# Altium footprint library Pasivos.PcbLib: 55 footprints (part 4 of 4)
Each footprint in its own frame and in the unit in brackets; x right, y up, seen from the top. Pads: shape width x height; smd on the part's side, far side on the other; paste and mask are expansions set on the pad; w line width, h text height; cw(c..) or ccw(c..) is an arc to the next point about the centre after c.
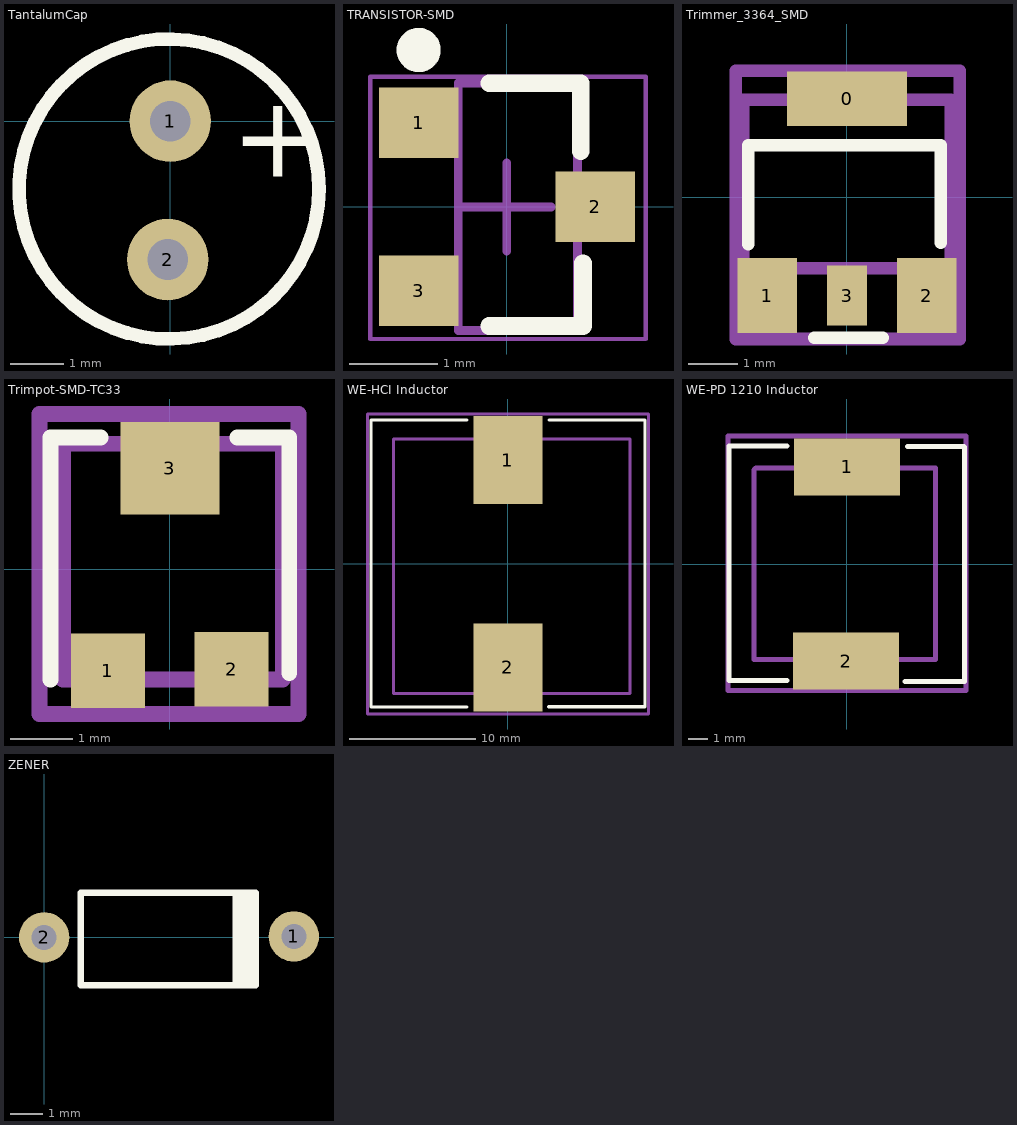
[diagram p3: the footprints below, top view; thin cyan lines are the x and y axes]

## TantalumCap [mil] "Tantalum Capacitor"
pads (2):
  round 60 hole 30: 1(0,0) 2(-2,-102)
Top Overlay:
  circle w10: c-1,-50 r110.49
  text "+" at 45,-41 h60
3D body: height 334.65, standoff -98.43, extent -83.62,-137.08 87.62,34

## TRANSISTOR-SMD [mm] "BC848B"
height 1
pads (3):
  rect 0.9x0.8 smd: 1(-1,0.95) 2(1,0) 3(-1,-0.95)
Top Overlay:
  circle w0.25: c-1,1.775 r0.125
  lines w0.2: -0.2,-1.351 0.862,-1.351 0.862,-0.64 ; -0.2,1.4 0.836,1.4 0.836,0.63
Mechanical 13:
  lines w0.1: -0.55,-1.402 -0.55,1.4 0.8,1.4 0.8,-1.402 -0.55,-1.402
Mechanical 15:
  lines w0.05: -1.549,-1.499 -1.549,1.473 1.575,1.473 1.575,-1.499 -1.549,-1.499
  lines w0.1: -0.502,-0.005 0.498,-0.005 ; -0.002,-0.505 -0.002,0.495
3D body: height 1.3, standoff 0, extent -1.426,-1.505 1.574,1.495

## Trimmer_3364_SMD [mm] "Surface Mount Trimmer Potentiometer Cermet Top Adjustment"
pads (4):
  rect 2.4x1.1 smd: 0(0,1.975)
  rect 1.2x1.5 smd: 1(-1.6,-1.975) 2(1.6,-1.975)
  rect 0.8x1.2 smd: 3(0,-1.975)
Top Overlay:
  lines w0.254: -1.981,-0.941 -1.981,1.04 1.88,1.04 1.88,-0.916 ; -0.66,-2.821 0.711,-2.821
Mechanical 13:
  lines w0.254: -2.083,-1.424 -2.083,1.955 2.083,1.955 2.083,-1.424 -2.083,-1.424
Mechanical 15:
  lines w0.254: -2.235,-2.846 2.261,-2.846 ; -2.235,-2.795 -2.235,2.539 2.261,2.539 ; 2.261,-2.795 2.261,2.513
3D body: height 1.01, standoff -0.06, extent -1.905,-2.269 1.895,1.961

## Trimpot-SMD-TC33 [mm] "Surface Mount Trimmer Potentiometer Cermet Top Adjustment"
pads (3):
  rect 1.2x1.2 smd: 1(-1,-1.638) 2(1,-1.612)
  rect 1.6x1.5 smd: 3(0,1.638)
Top Overlay:
  lines w0.254: -1.93,-1.778 -1.93,2.134 -1.118,2.134 ; 1.092,2.134 1.93,2.134 1.93,-1.676
Mechanical 13:
  lines w0.254: 1.753,2.032 -1.727,2.032 -1.727,-1.778 1.829,-1.778 1.829,1.956
Mechanical 15:
  lines w0.254: -2.108,-2.337 -2.108,2.515 2.083,2.515 2.083,-2.337 -2.108,-2.337
3D body: height 1.13, standoff -0.02, extent -1.753,-1.868 1.847,2.095

## WE-HCI Inductor [mm] "WE-HCI SMD Flat Wire High Current  Inductor"
pads (2):
  rect 5.5x7 smd: 1(0,8.25) 2(0,-8.25)
Top Overlay:
  lines w0.254: -3.277,11.43 -10.897,11.43 -10.897,-11.405 -3.251,-11.405 ; 3.251,-11.379 10.922,-11.379 10.922,11.43 3.277,11.43
Mechanical 13:
  lines w0.254: -9.093,-10.343 9.728,-10.343 9.728,9.926 -9.093,9.926 -9.093,-10.343
Mechanical 15:
  lines w0.254: -11.176,-11.963 11.201,-11.963 11.201,11.913 -11.176,11.913 -11.176,-11.963
3D body: height 11.8, standoff -0.2, extent -11,-11.252 11,11.248

## WE-PD 1210 Inductor [mm] "WE-PD SMD Shielded Power Inductor"
pads (2):
  rect 5.4x2.9 smd: 1(0.025,4.95) 2(-0.025,-4.95)
Top Overlay:
  lines w0.254: -3.023,-5.944 -5.994,-5.944 -5.994,6.02 -3.023,6.02 ; 2.972,-5.994 6.02,-5.994 6.02,5.969 ; 3.099,5.994 5.994,5.994
Mechanical 13:
  lines w0.254: -4.724,-4.877 -4.724,4.801 -4.623,4.902 4.547,4.902 4.547,-4.877 -4.724,-4.877
Mechanical 15:
  lines w0.254: -6.045,-6.452 -6.045,6.528 6.096,6.528 6.096,-6.452 -6.045,-6.452
3D body: height 10.33, standoff -0.05, extent -5.98,-5.978 6.02,6.022

## ZENER [mil] "Zener Diode 1W"
pads (2):
  round 60 hole 30: 1(298,1) 2(0,0)
Top Overlay:
  rectangle: 224.77,-57.12 256.27,53.12
  lines w7.87: 252.33,-57.12 43.67,-57.12 43.67,53.12 252.33,53.12
3D body: height 111.56, standoff -59.06, extent -16.5,-54.37 314.5,50.37